# Altium footprint library mPCIe_Breakout01_BRD1.PcbLib: 41 footprints (part 3 of 3)
Each footprint in its own frame and in the unit in brackets; x right, y up, seen from the top. Pads: shape width x height; smd on the part's side, far side on the other; paste and mask are expansions set on the pad; w line width, h text height; cw(c..) or ccw(c..) is an arc to the next point about the centre after c.
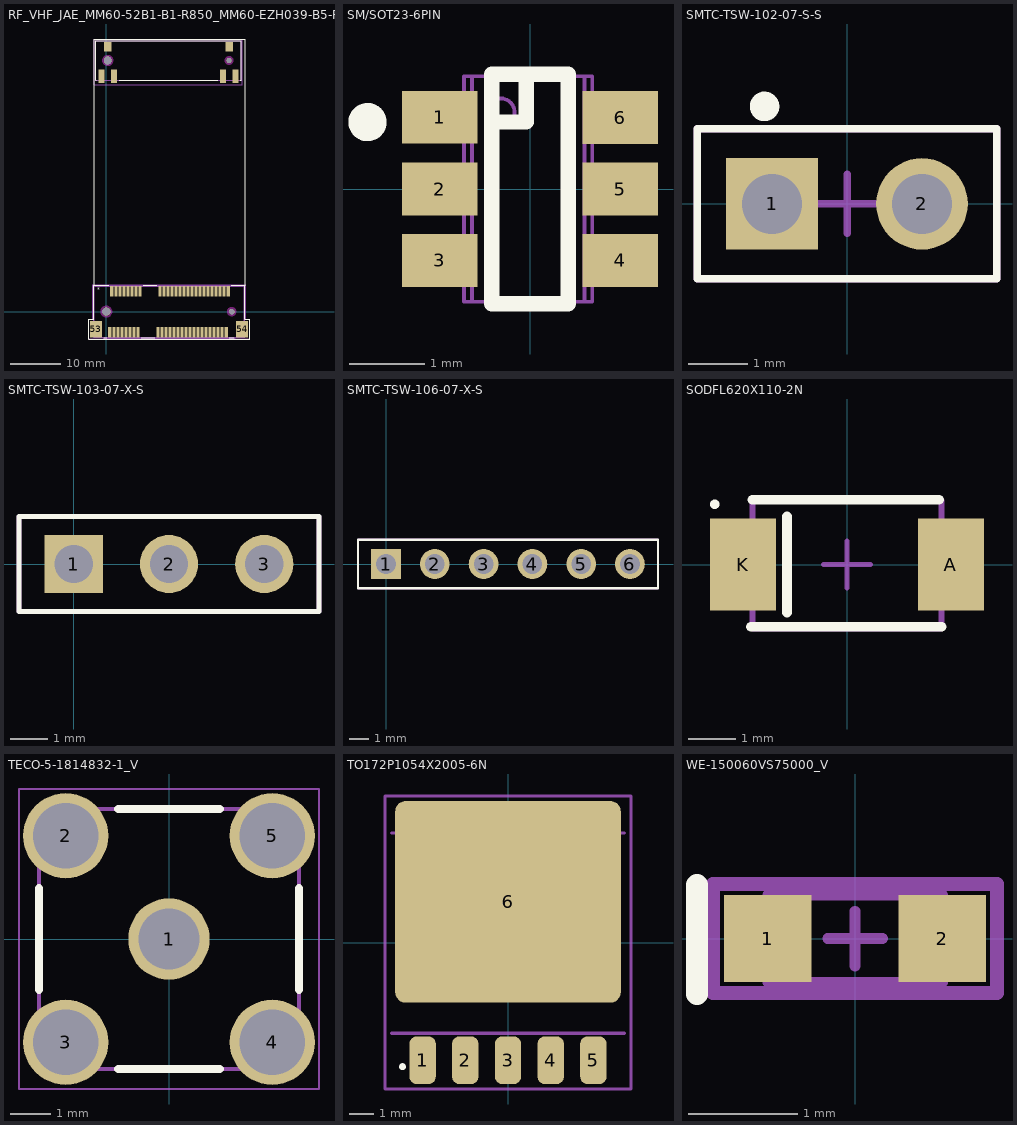
[diagram p2: the footprints below, top view; thin cyan lines are the x and y axes]

## RF_VHF_JAE_MM60-52B1-B1-R850_MM60-EZH039-B5-R850_w_2005_mPCIe_card [mm]
height 1.16
pads (64):
  rect 0.635x2.108 smd mask+0.025: 1(0.7,-4.1) 2(1.1,4.1) 3(1.5,-4.1) 4(1.9,4.1) 5(2.3,-4.1) 6(2.7,4.1) 7(3.1,-4.1) 8(3.5,4.1) 9(3.9,-4.1) 10(4.3,4.1) 11(4.7,-4.1) 12(5.1,4.1) 13(5.5,-4.1) 14(5.9,4.1) 15(6.3,-4.1) 16(6.7,4.1) 17(10.3,-4.1) 18(10.7,4.1) 19(11.1,-4.1) 20(11.5,4.1) 21(11.9,-4.1) 22(12.3,4.1) 23(12.7,-4.1) 24(13.1,4.1) 25(13.5,-4.1) 26(13.9,4.1) 27(14.3,-4.1) 28(14.7,4.1) 29(15.1,-4.1) 30(15.5,4.1) 31(15.9,-4.1) 32(16.3,4.1) 33(16.7,-4.1) 34(17.1,4.1) 35(17.5,-4.1) 36(17.9,4.1) 37(18.3,-4.1) 38(18.7,4.1) 39(19.1,-4.1) 40(19.5,4.1) 41(19.9,-4.1) 42(20.3,4.1) 43(20.7,-4.1) 44(21.1,4.1) 45(21.5,-4.1) 46(21.9,4.1) 47(22.3,-4.1) 48(22.7,4.1) 49(23.1,-4.1) 50(23.5,4.1) 51(23.9,-4.1) 52(24.3,4.1)
  rect 2.438x3.353 smd: 53(-2.075,-3.5) 54(27.075,-3.5)
  rect 1.5x1.9 smd: S1_1(0.288,52.839) S2_1(24.488,52.839)
  rect 1.2x2.7 smd: S1_2(-0.962,46.939) S1_3(1.538,46.939) S2_2(23.238,46.939) S2_3(25.738,46.939)
  round 1.626 hole 1.626 unplated: ""(0,0)
  round 1.55 hole 1.55 unplated mask+0.102: ""(0.288,50.089)
  round 1.05 hole 1.05 unplated: ""(24.488,50.089)
  round 1.118 hole 1.118 unplated: ""(25,0)
Top Overlay:
  lines w0.127: -2.54,5.182 -2.54,54.356 ; -2.54,54.371 27.61,54.371 27.61,5.207 ; -1.962,46.139 -2.112,46.139 -2.112,54.039 26.888,54.039 26.888,46.139 26.738,46.139 ; 0.445,5.227 -2.54,5.227 -2.54,-1.524 -3.505,-1.524 -3.505,-5.461 28.6,-5.461 28.6,-1.524 27.61,-1.524 27.61,5.227 24.955,5.227 ; 2.538,46.139 22.238,46.139
  lines w0.152: -0.529,-5.238 0.048,-5.238 ; 6.952,-5.238 9.648,-5.238 ; 7.355,5.227 10.045,5.227 ; 24.552,-5.238 25.529,-5.238
  text "*" at -1.84,4.1 h0.79
Top Solder:
  region: 25,0.82 24.788,0.792 24.59,0.71 24.42,0.58 24.29,0.41 24.208,0.212 24.18,0 24.208,-0.212 24.29,-0.41 24.42,-0.58 24.59,-0.71 24.788,-0.792 25,-0.82 25.212,-0.792 25.41,-0.71 25.58,-0.58 25.71,-0.41 25.792,-0.212 25.82,0 25.792,0.212 25.71,0.41 25.58,0.58 25.41,0.71 25.212,0.792
  region: 0,1.076 -0.278,1.039 -0.538,0.932 -0.761,0.761 -0.932,0.538 -1.039,0.278 -1.076,0 -1.039,-0.279 -0.932,-0.538 -0.761,-0.761 -0.538,-0.932 -0.278,-1.039 0,-1.076 0.278,-1.039 0.538,-0.932 0.761,-0.761 0.932,-0.538 1.039,-0.279 1.076,0 1.039,0.278 0.932,0.538 0.761,0.761 0.538,0.932 0.278,1.039
Keep-Out Layer:
  circle w0.381: c24.486,50.089 r0.711
  circle w0.381: c0.279,50.089 r0.94
  circle w0.381: c25,0 r0.762
  circle w0.381: c0,0 r1.016
Board Outline:
  text "*" at -1.84,4.1 h0.79
Assembly Top:
  lines w0.05: -2.362,45.239 27.138,45.239 27.138,54.289 -2.362,54.289 -2.362,45.239
  lines w0.127: -2.112,46.139 -2.112,54.039 ; -2.112,46.139 26.888,46.139 ; -2.112,46.139 -2.112,54.039 ; -2.112,46.139 26.888,46.139 ; -2.112,54.039 26.888,54.039 ; -2.112,54.039 26.888,54.039 ; 26.888,46.139 26.888,54.039 ; 26.888,46.139 26.888,54.039 ; -2.499,-5.162 27.499,-5.162 27.499,5.049 -2.499,5.049 -2.499,-5.162
  lines w0.152: -3.482,-5.414 -0.536,-5.414 -0.536,-5.349 25.668,-5.349 25.668,-5.414 28.614,-5.414 28.614,-1.554 27.819,-1.554 27.819,5.37 -2.692,5.37 -2.692,-1.554 -3.482,-1.554 -3.482,-5.414 ; -2.433,-5.095 -2.433,5.116 27.565,5.116 27.565,-5.095 -2.433,-5.095
  text ".Designator" at -2.438,-7.131 h1.52
3D body "K3D-MM60-52B1-B1-R2 JAE Connector Division Proprietary.STEP": height 3.8, standoff -0.9, extent -2.36,-5.04 27.34,4.96
3D body "TILE-LB_102120211208.step": height 6.9, standoff 1.77, extent -2.484,-0.085 27.516,50.865
3D body "K3D-MM60-EZH039-B5-R2 JAE Connector Division Proprietary.STEP": height 4.7, standoff -0.9, extent -2.112,46.164 26.888,54.064

## SM/SOT23-6PIN [mm]
pads (6):
  rect 1x0.7 smd mask+0.064: 1(-1.2,0.953)
  rect 1x0.7 smd mask+0.038: 2(-1.2,0) 3(-1.2,-0.95) 4(1.2,-0.95) 5(1.2,0) 6(1.2,0.95)
Top Overlay:
  circle w0.254: c-2.159,0.889 r0.127
  lines w0.203: -0.508,0.889 -0.05,0.889 -0.05,1.524 ; -0.508,-1.524 -0.508,1.524 0.508,1.524 0.508,-1.524 -0.508,-1.524
Assembly Top:
  lines w0.051: -1.393,-1.207 -1.393,-0.699 ; -1.393,-0.254 -1.393,0.254 ; -1.393,0.698 -1.393,1.206 ; -1.367,-1.207 -1.367,-0.699 ; -1.367,-0.254 -1.367,0.254 ; -1.367,0.698 -1.367,1.206 ; -1.28,-1.207 -1.28,-0.699 ; -1.28,-0.254 -1.28,0.254 ; -1.28,0.698 -1.28,1.206 ; -1.003,-1.207 -1.003,-0.699 ; -1.003,-0.254 -1.003,0.254 ; -1.003,0.698 -1.003,1.206 ; -0.876,-1.207 -0.876,-1.499 0.826,-1.499 0.826,-1.207 ; -0.876,-0.699 -0.876,-0.254 ; -0.876,0.254 -0.876,0.698 ; -0.876,1.206 -0.876,1.498 0.826,1.498 0.826,1.206 ; -0.773,-1.499 -0.773,1.498 ; 0.723,-1.499 0.723,1.498 ; 0.826,-0.699 0.826,-0.254 ; 0.826,0.254 0.826,0.698 ; 0.978,-1.207 0.978,-0.699 ; 0.978,-0.254 0.978,0.254 ; 0.978,0.698 0.978,1.206 ; 1.256,-1.207 1.256,-0.699 ; 1.256,-0.254 1.256,0.254 ; 1.256,0.698 1.256,1.206 ; 1.343,-1.207 1.343,-0.699 ; 1.343,-0.254 1.343,0.254 ; 1.343,0.698 1.343,1.206 ; 1.368,-1.207 1.368,-0.699 ; 1.368,-0.254 1.368,0.254 ; 1.368,0.698 1.368,1.206 ; -1.511,-1.207 -0.845,-1.207 -0.845,-0.699 -1.511,-0.699 -1.511,-1.207 ; -1.511,-0.254 -0.845,-0.254 -0.845,0.254 -1.511,0.254 -1.511,-0.254 ; -1.511,0.698 -0.845,0.698 -0.845,1.206 -1.511,1.206 -1.511,0.698 ; -0.392,0.827 ccw(c-0.392,1.016) -0.392,1.204 ccw(c-0.392,1.016) -0.392,0.827 ; 0.795,-1.207 0.795,-0.699 1.486,-0.699 1.486,-1.207 0.795,-1.207 ; 0.795,-0.254 0.795,0.254 1.486,0.254 1.486,-0.254 0.795,-0.254 ; 0.795,0.698 0.795,1.206 1.486,1.206 1.486,0.698 0.795,0.698
  text ".designator" at -1.829,-2.87 h1.52
3D body "sot23_6p.STEP": height 1.45, standoff 0, extent -1.486,-1.499 1.511,1.499

## SMTC-TSW-102-07-S-S [mm] "Header, 2-Leads, Body 5.08x2.54mm, Pitch 2.54mm"
height 8.38
pads (2):
  rect 1.55x1.55 hole 1.02: 1(-1.27,0)
  round 1.55 hole 1.02: 2(1.27,0)
Top Overlay:
  circle w0.25: c-1.397,1.651 r0.125
  lines w0.127: -2.54,-1.27 2.54,-1.27 2.54,1.27 -2.54,1.27 -2.54,-1.27
Assembly Top:
  lines w0.127: -0.5,0 0.5,0 ; 0,-0.5 0,0.5 ; -2.54,-1.27 2.54,-1.27 2.54,1.27 -2.54,1.27 -2.54,-1.27
  text ".Designator" at -2.946,2.495 h1.52
3D body "TSW-102-07-S-S.stp": height 8.38, standoff -2.54, extent -2.54,-1.27 2.667,1.27

## SMTC-TSW-103-07-X-S [mm] ".025 SQ Post Terminal Strip Assembly, 1x3 Pins, Vertical, 2.54mm Pitch, Male"
height 8.58
pads (3):
  rect 1.55x1.55 hole 1.02: 1(0,0)
  round 1.55 hole 1.02: 2(2.54,0) 3(5.08,0)
Top Overlay:
  lines w0.127: -1.46,-1.27 6.54,-1.27 6.54,1.27 -1.46,1.27 -1.46,-1.27
Assembly Top:
  lines w0.127: -1.46,-1.27 6.54,-1.27 6.54,1.27 -1.46,1.27 -1.46,-1.27
  text ".Designator" at -0.813,1.911 h1.52
3D body "TSW-103-07-X-S.step": height 8.38, standoff -2.54, extent -1.27,-1.27 6.35,1.27

## SMTC-TSW-106-07-X-S [mm] ".025 SQ Post Terminal Strip Assembly, 1x6 Pins, Vertical, 2.54mm Pitch, Male"
height 8.58
pads (6):
  rect 1.55x1.55 hole 1.02: 1(0,0)
  round 1.55 hole 1.02: 2(2.54,0) 3(5.08,0) 4(7.62,0) 5(10.16,0) 6(12.7,0)
Top Overlay:
  lines w0.127: -1.46,-1.27 14.16,-1.27 14.16,1.27 -1.46,1.27 -1.46,-1.27
Assembly Top:
  lines w0.127: -1.46,-1.27 14.16,-1.27 14.16,1.27 -1.46,1.27 -1.46,-1.27
  text ".Designator" at -1.168,1.911 h1.52
3D body "TSW-106-07-X-S.step": height 8.38, standoff -2.54, extent -1.27,-1.24 13.97,1.3

## SODFL620X110-2N [mm] "SODFL, 2-Leads, Body 2.50x6.20mm, IPC Medium Density"
height 1.1
pads (2):
  rect 1.4x1.95 smd: A(2.2,0) K(-2.2,0)
Top Overlay:
  circle w0.1: c-2.8,1.275 r0.05
  lines w0.203: -2.032,-1.321 2.007,-1.321 ; -2.007,1.372 1.956,1.372 ; -1.27,-1.016 -1.27,1.016
Assembly Top:
  lines w0.127: -2,-1.35 2,-1.35 2,1.35 -2,1.35 -2,-1.35
  text ".Designator" at -3.556,1.937 h1.52
V-GROOVE:
  lines w0.1: -0.5,0 0.5,0 ; 0,-0.5 0,0.5
3D body: height 1.1, standoff 0, extent -2,-1.35 2,1.35

## TECO-5-1814832-1_V [mm] "THD, 5-Leads, Body 6.4x6.4mm, Pitch 5.08mm"
height 9.5
pads (5):
  round 2 hole 1.5: 1(0,0)
  round 2.1 hole 1.6: 2(-2.54,2.54) 3(-2.54,-2.54) 4(2.54,-2.54) 5(2.54,2.54)
Top Overlay:
  lines w0.2: -3.2,-1.249 -3.2,1.249 ; -1.249,-3.2 1.249,-3.2 ; -1.249,3.2 1.249,3.2 ; 3.2,-1.249 3.2,1.249
3D Models:
  lines w0.1: -3.2,-3.2 -3.2,3.2 3.2,3.2 3.2,-3.2 -3.2,-3.2
V-GROOVE:
  lines w0.05: -3.69,-3.69 3.69,-3.69 3.69,3.69 -3.69,3.69 -3.69,-3.69
  lines w0.1: -0.5,0 0.5,0 ; 0,-0.5 0,0.5
3D body "c-5-1814832-1-b-3d.stp": height 9.5, standoff -4, extent -3.208,-3.208 3.192,3.192

## TO172P1054X2005-6N [mm]
pads (6):
  rrect53% 1.06x1.92 smd: 1(-3.44,-4.74) 2(-1.72,-4.74) 3(0,-4.74) 4(1.72,-4.74) 5(3.44,-4.74)
  rrect10% 9.09x8.12 smd paste-6: 6(0,1.64)
Top Overlay:
  circle w0.127: c-4.25,-5 r0.076
Top Paste:
  region: 0.7,1.995 -0.7,1.995 -0.7,3.315 0.7,3.315
  region: -1.12,1.998 -2.524,1.998 -2.524,3.315 -1.12,3.315
  region: 2.52,1.997 1.121,1.997 1.121,3.315 2.52,3.315
  region: -2.94,1.995 -4.341,1.995 -4.341,3.315 -2.94,3.315
  region: 4.34,1.997 2.943,1.997 2.943,3.315 4.34,3.315
  region: -2.94,-0.035 -4.343,-0.035 -4.343,1.285 -2.94,1.285
  region: -2.94,-2.068 -4.345,-2.068 -4.345,-0.745 -2.94,-0.745
  region: -2.94,4.029 -4.344,4.029 -4.344,5.345 -2.94,5.345
  region: -1.12,4.027 -2.521,4.027 -2.521,5.345 -1.12,5.345
  region: 0.7,4.029 -0.701,4.029 -0.701,5.345 0.7,5.345
  region: 2.52,4.027 1.121,4.027 1.121,5.345 2.52,5.345
  region: 4.34,4.03 2.944,4.03 2.944,5.345 4.34,5.345
  region: 4.34,-0.035 2.942,-0.035 2.942,1.285 4.34,1.285
  region: 4.34,-2.068 2.944,-2.068 2.944,-0.745 4.34,-0.745
  region: 2.52,-0.035 1.12,-0.035 1.12,1.285 2.52,1.285
  region: 2.52,-2.067 1.121,-2.067 1.121,-0.745 2.52,-0.745
  region: -1.12,-0.035 -2.522,-0.035 -2.522,1.285 -1.12,1.285
  region: -1.12,-2.068 -2.524,-2.068 -2.524,-0.745 -1.12,-0.745
  region: 0.7,-0.035 -0.701,-0.035 -0.701,1.285 0.7,1.285
  region: 0.7,-2.069 -0.701,-2.069 -0.701,-0.745 0.7,-0.745
Assembly Top:
  lines w0.127: -4.697,-3.652 4.697,-3.652 ; -4.697,4.418 4.697,4.418 ; -4.96,-5.9 4.96,-5.9 4.96,5.9 -4.96,5.9 -4.96,-5.9
  text ".Designator" at -4.394,6.458 h1.52
3D body "HRP5_rev1.STEP": height 1.91, standoff -0.08, extent -4.696,-4.953 4.699,5.587

## WE-150060VS75000_V [mm] "SMD, 2-Leads, Body 1.6x0.8mm"
height 0.8
pads (2):
  rect 0.8x0.8 smd: 1(-0.8,0) 2(0.8,0)
Top Overlay:
  lines w0.2: -1.448,-0.508 -1.448,0.492
Assembly Top:
  lines w0.1: -0.25,0 0.25,0 ; 0,-0.25 0,0.25
  lines w0.127: -1.3,-0.5 1.3,-0.5 1.3,0.5 -1.3,0.5 -1.3,-0.5
  text ".Designator" at -3.683,0.921 h1.52
3D Models:
  lines w0.1: -0.8,-0.4 -0.8,0.4 0.8,0.4 0.8,-0.4 -0.8,-0.4
  lines w0.152: -1.448,-0.508 -1.448,0.492
3D body "STEP-WL-SMCW-0603-rev1.stp": height 0.7, standoff 0, extent -0.8,-0.4 0.8,0.4